# Altium footprint library XU-GENARAL PCB .PcbLib: 1176 footprints (part 29 of 75)
Each footprint in its own frame and in the unit in brackets; x right, y up, seen from the top. Pads: shape width x height; smd on the part's side, far side on the other; paste and mask are expansions set on the pad; w line width, h text height; cw(c..) or ccw(c..) is an arc to the next point about the centre after c.
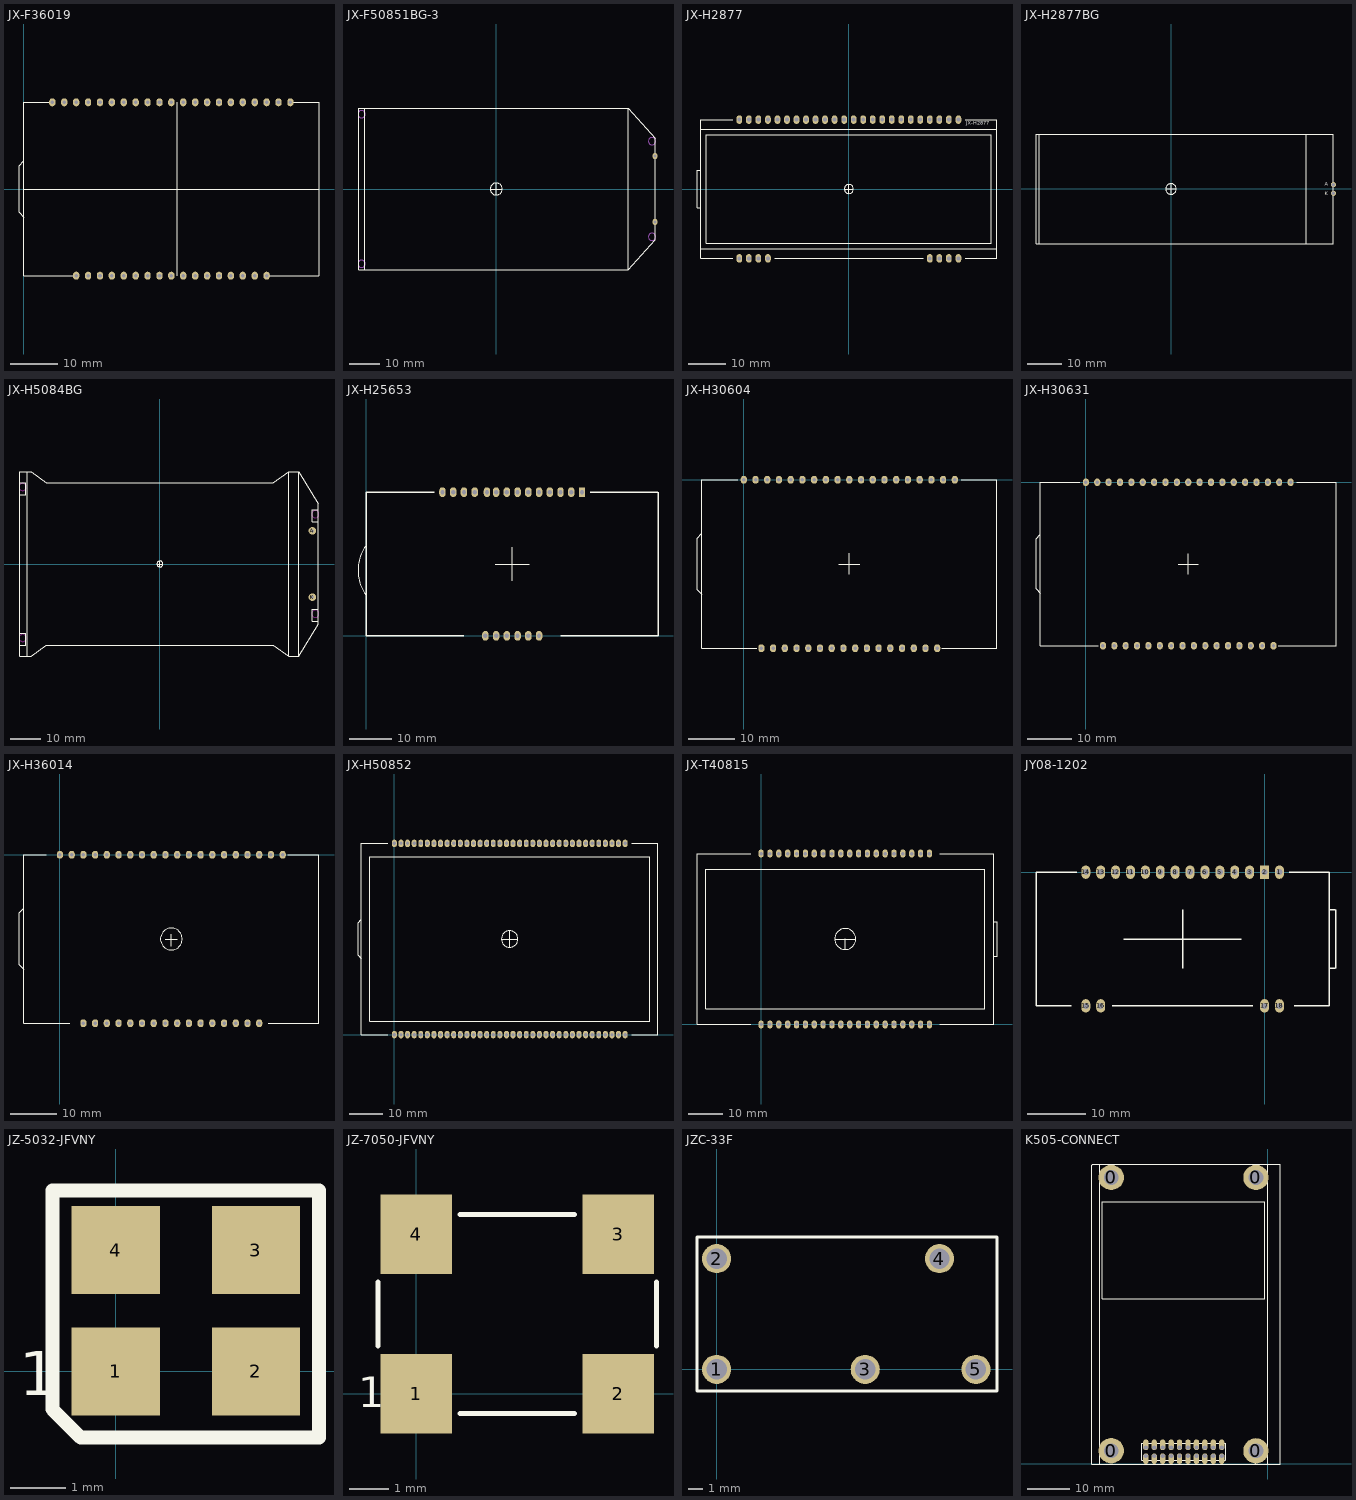
[diagram p28: the footprints below, top view; thin cyan lines are the x and y axes]

## JX-F36019 [mm]
pads (38):
  oval 1.35x1.7 hole 0.762: 1(6.092,18.505) 2(8.632,18.505) 3(11.172,18.505) 4(13.712,18.505) 5(16.252,18.505) 6(18.792,18.505) 7(21.332,18.505) 8(23.872,18.505) 9(26.412,18.505) 10(28.952,18.505) 11(31.492,18.505) 12(34.032,18.505) 13(36.572,18.505) 14(39.112,18.505) 15(41.652,18.505) 16(44.192,18.505) 17(46.732,18.505) 18(49.272,18.505) 19(51.812,18.505) 20(54.352,18.505) 21(56.892,18.505) 22(51.812,-18.495) 23(49.272,-18.495) 24(46.732,-18.495) 25(44.192,-18.495) 26(41.652,-18.495) 27(39.112,-18.495) 28(36.572,-18.495) 29(34.032,-18.495) 30(31.492,-18.495) 31(28.952,-18.495) 32(26.412,-18.495) 33(23.872,-18.495) 34(21.332,-18.495) 35(18.792,-18.495) 36(16.252,-18.495) 37(13.712,-18.495) 38(11.172,-18.495)
Top Overlay:
  lines w0.203: -1.025,4.994 -0.025,5.994 ; -1.016,5 -1.016,-5 -0.016,-6 ; -0.008,18.505 6.092,18.505 ; -0.004,18.505 -0.004,-18.495 11.172,-18.495 ; 0,0 1.266,0 62.988,0 ; 32.762,-18.495 32.762,18.513 ; 51.812,-18.495 62.988,-18.495 ; 56.892,18.505 62.992,18.505 62.992,-18.495

## JX-F50851BG-3 [mm]
pads (2):
  oval 1.6x2 hole 1: A(53,11) K(53,-11)
Top Overlay:
  circle w0.127: c0,0 r2
  lines w0.127: -2.032,0 0,0 ; 0,-2.032 0,0 ; 0,1.905 0,0 ; 2,0 0,0 ; -44,-27 44,-27 ; -44,-27 -44,27 ; -44,-27 -46,-27 -46,27 -44,27 ; -44,27 44,27 ; 44,-27 44,27 ; 44,-27 53,-17 53,17 44,27
Mechanical 1:
  circle w0.127: c-45,25 r1.2
  circle w0.127: c-45,-25 r1.2
  circle w0.127: c52,16 r1.2
  circle w0.127: c52,-16 r1.2

## JX-H2877 [mil]
pads (32):
  oval 60x90 hole 40: 1(-1149.88,728.35) 2(-1049.88,728.35) 3(-949.88,728.35) 4(-849.88,728.35) 5(-749.88,728.35) 6(-649.88,728.35) 7(-549.88,728.35) 8(-449.88,728.35) 9(-349.88,728.35) 10(-249.88,728.35) 11(-149.88,728.35) 12(-49.88,728.35) 13(50.12,728.35) 14(150.12,728.35) 15(250.12,728.35) 16(350.12,728.35) 17(450.12,728.35) 18(550.12,728.35) 19(650.12,728.35) 20(750.12,728.35) 21(850.12,728.35) 22(950.12,728.35) 23(1050.12,728.35) 24(1150.12,728.35) 25(-1149.88,-728.35) 26(-1049.88,-728.35) 27(-949.88,-728.35) 28(-849.88,-728.35) 29(850.12,-728.35) 30(950.12,-728.35) 31(1050.12,-728.35) 32(1150.12,-728.35)
Top Overlay:
  circle w5: c0.12,0 r47.24
  lines w5: -1555,-629.92 1555.24,-629.92 ; -1555,-196.65 -1555.2,-196.85 -1594.37,-196.85 -1594.37,196.85 -1555,196.85 ; -1555,629.92 1555.24,629.92 ; -1220,-728.35 -1555,-728.35 -1555,728.35 -1220,728.35 ; -780,-728.35 780,-728.35 ; -45,0 0,0 ; 0,-45 0,0 ; 0,45 0,0 ; 47.24,0 0,0 ; 1220,-728.35 1555.24,-728.35 1555.24,728.35 1220,728.35 ; -1495.94,570.87 -1495.94,-570.87 1496.18,-570.87 1496.18,570.87 ; -1495.94,570.87 1496.18,570.87 ; -1495.94,570.87 1496.18,570.87
  text "JX-H2877" at 1235,675 h40

## JX-H2877BG [mm]
pads (2):
  round 1.5 hole 1: A(47.503,1.27) K(47.503,-1.27)
Top Overlay:
  circle w0.127: c0.003,-0.002 r1.545
  lines w0.127: -38.497,-16.002 -38.497,15.998 ; -1.524,0 1.546,0 ; 0,-1.524 0,0 0,1.524 ; 39.503,-16.002 39.503,15.998 ; -39.497,-16.002 -39.497,15.998 47.503,15.998 47.503,-16.002 -39.497,-16.002
  text "A" at 44.958,1.016 h1.02
  text "K" at 44.958,-1.778 h1.02

## JX-H5084BG [mm]
pads (2):
  round 2.5 hole 1: A(50.5,11) K(50.5,-11)
Top Overlay:
  circle w0.127: c0,0 r1
  lines w0.127: -46.5,23 -44.5,23 -44.5,27 -46.5,27 ; -46.482,-27 -44.482,-27 -44.482,-23 -46.482,-23 ; -44,-30.5 -44,30.5 ; -1.016,0 0,0 ; 0,-1.016 0,0 ; 0,0.889 0,0 ; 1,0 0,0 ; 51.689,-15 52.5,-15 ; 51.689,18 52.5,18 ; 42.6,-30.5 42.6,30.5 ; 42.6,-30.5 37.6,-27 -37.6,-27 -42.6,-30.5 -46.5,-30.5 -46.5,30.5 -42.6,30.5 -37.6,27 37.6,27 42.6,30.5 ; 42.6,-30.5 46,-30.5 ; 42.6,30.5 46,30.5 ; 46,-30.5 46,30.5 ; 46,-30.5 52.5,-20 52.5,20 46,30.5 ; 52.5,-15 50.5,-15 50.5,-19 52.5,-19 52.5,-15 ; 52.5,18 50.5,18 50.5,14 52.5,14 52.5,18
Keep-Out Layer:
  circle w0.1: c-45.5,25.5 r1.2
  circle w0.1: c-45.482,-24.5 r1.2
  circle w0.1: c51.5,16.5 r1.2
  circle w0.1: c51.5,-16.5 r1.2

## JX-H25653 [mil]
pads (20):
  rect 60x90 hole 40: 1(2008.27,1338.58)
  oval 60x90 hole 40: 2(1908.27,1338.58) 3(1808.27,1338.58) 4(1708.27,1338.58) 5(1608.27,1338.58) 6(1508.27,1338.58) 7(1408.27,1338.58) 8(1308.27,1338.58) 9(1208.27,1338.58) 10(1122.84,1338.58) 11(1008.27,1338.58) 12(908.27,1338.58) 13(808.27,1338.58) 14(708.27,1338.58) 15(1108.27,0) 16(1208.27,0) 17(1308.27,0) 18(1408.27,0) 19(1508.27,0) 20(1608.27,0)
Top Overlay:
  lines w10: -7.54,384.42 cw(c314.96,610.24) -7.54,836.05 ; 1200.79,669.29 1358.27,669.29 ; 1358.27,511.81 1358.27,669.29 ; 1358.27,826.77 1358.27,669.29 ; 1515.75,669.29 1358.27,669.29
  lines w11.81: 629.92,1338.58 0,1338.58 0,0 908.27,0 ; 1808.27,0 2716.53,0 2716.53,1338.58 ; 2086.08,1338.58 2716,1338.58

## JX-H30604 [mm]
pads (35):
  oval 1.35x1.7 hole 0.762: 1(0,0) 2(2.54,0) 3(5.08,0) 4(7.62,0) 5(10.16,0) 6(12.7,0) 7(15.24,0) 8(17.78,0) 9(20.32,0) 10(22.86,0) 11(25.4,0) 12(27.94,0) 13(30.48,0) 14(33.02,0) 15(35.56,0) 16(38.1,0) 17(40.64,0) 18(43.18,0) 19(45.72,0) 20(41.91,-36.5) 21(39.37,-36.5) 22(36.83,-36.5) 23(34.29,-36.5) 24(31.75,-36.5) 25(29.21,-36.5) 26(26.67,-36.5) 27(24.13,-36.5) 28(21.59,-36.5) 29(19.05,-36.5) 30(16.51,-36.5) 31(13.97,-36.5) 32(11.43,-36.5) 33(8.89,-36.5) 34(6.35,-36.5) 35(3.81,-36.5)
Top Overlay:
  lines w0.203: -9.14,-24.816 -9.14,-24.8 -10.14,-23.8 -10.14,-12.624 -9.14,-11.624 ; -1.346,0 -9.14,0 -9.14,-36.5 2.794,-36.5 ; 20.612,-18.25 21.59,-18.25 24.13,-18.25 25.108,-18.25 ; 22.86,-20.498 22.86,-19.736 22.86,-17.196 ; 22.86,-17.704 22.86,-16.434 22.86,-15.926 ; 42.926,-36.5 54.86,-36.5 54.86,0 47.066,0

## JX-H30631 [mm]
pads (35):
  oval 1.35x1.7 hole 0.762: 1(0,0) 2(2.54,0) 3(5.08,0) 4(7.62,0) 5(10.16,0) 6(12.7,0) 7(15.24,0) 8(17.78,0) 9(20.32,0) 10(22.86,0) 11(25.4,0) 12(27.94,0) 13(30.48,0) 14(33.02,0) 15(35.56,0) 16(38.1,0) 17(40.64,0) 18(43.18,0) 19(45.72,0) 20(41.91,-36.5) 21(39.37,-36.5) 22(36.83,-36.5) 23(34.29,-36.5) 24(31.75,-36.5) 25(29.21,-36.5) 26(26.67,-36.5) 27(24.13,-36.5) 28(21.59,-36.5) 29(19.05,-36.5) 30(16.51,-36.5) 31(13.97,-36.5) 32(11.43,-36.5) 33(8.89,-36.5) 34(6.35,-36.5) 35(3.81,-36.5)
Top Overlay:
  lines w0.203: -10.14,-24.8 -11.14,-23.8 -11.14,-12.624 -10.14,-11.624 ; -1.346,0 -10.14,0 -10.14,-36.5 2.794,-36.5 ; 20.612,-18.25 21.59,-18.25 24.13,-18.25 25.108,-18.25 ; 22.86,-20.498 22.86,-19.736 22.86,-17.196 ; 22.86,-17.704 22.86,-16.434 22.86,-15.926 ; 42.926,-36.5 55.86,-36.5 55.86,0 47.066,0

## JX-H36014 [mm]
pads (38):
  oval 1.35x1.7 hole 0.762: 1(0,0) 1(0,0) 2(2.54,0) 3(5.08,0) 4(7.62,0) 5(10.16,0) 6(12.7,0) 7(15.24,0) 8(17.78,0) 9(20.32,0) 10(22.86,0) 11(25.4,0) 12(27.94,0) 13(30.48,0) 14(33.02,0) 15(35.56,0) 16(38.1,0) 17(40.64,0) 18(43.18,0) 19(45.72,0) 20(48.26,0) 21(43.18,-36.5) 21(43.18,-36.5) 22(40.64,-36.5) 23(38.1,-36.5) 24(35.56,-36.5) 25(33.02,-36.5) 26(30.48,-36.5) 27(27.94,-36.5) 28(25.4,-36.5) 29(22.86,-36.5) 30(20.32,-36.5) 31(17.78,-36.5) 32(15.24,-36.5) 33(12.7,-36.5) 34(10.16,-36.5) 35(7.62,-36.5) 36(5.08,-36.5)
Top Overlay:
  circle w0.203: c24.13,-18.25 r2.357
  lines w0.203: -7.87,-24.788 -8.87,-23.788 -8.87,-12.612 -7.87,-11.612 ; -3,0 -7.87,0 -7.87,-36.5 2.13,-36.5 ; 22.844,-18.25 25.384,-18.25 ; 24.13,-19.774 24.13,-17.234 ; 45.13,-36.5 56.13,-36.5 56.13,0 49.38,0

## JX-H50852 [mm]
pads (72):
  oval 1.5x2.286 hole 1.016: 1(0,0) 2(2,0) 3(4,0) 4(6,0) 5(8,0) 6(10,0) 7(12,0) 8(14,0) 9(16,0) 10(18,0) 11(20,0) 12(22,0) 13(24,0) 14(26,0) 15(28,0) 16(30,0) 17(32,0) 18(34,0) 19(36,0) 20(38,0) 21(40,0) 22(42,0) 23(44,0) 24(46,0) 25(48,0) 26(50,0) 27(52,0) 28(54,0) 29(56,0) 30(58,0) 31(60,0) 32(62,0) 33(64,0) 34(66,0) 35(68,0) 36(70,0) 37(70,58) 38(68,58) 39(66,58) 40(64,58) 41(62,58) 42(60,58) 43(58,58) 44(56,58) 45(54,58) 46(52,58) 47(50,58) 48(48,58) 49(46,58) 50(44,58) 51(42,58) 52(40,58) 53(38,58) 54(36,58) 55(34,58) 56(32,58) 57(30,58) 58(28,58) 59(26,58) 60(24,58) 61(22,58) 62(20,58) 63(18,58) 64(16,58) 65(14,58) 66(12,58) 67(10,58) 68(8,58) 69(6,58) 70(4,58) 71(2,58) 72(0,58)
Top Overlay:
  circle w0.254: c34.968,29 r2.5
  lines w0.203: -10.032,23 -11.032,24 -11.032,29 -11.032,34 -10.032,35 ; -2.032,0 -10.032,0 -10.032,58 -2.032,58 ; 32.468,29 37.468,29 ; 34.968,26.5 34.968,31.5 ; 71.968,0 79.968,0 79.968,58 71.968,58 ; -7.532,4 77.468,4 77.468,54 -7.532,54 -7.532,4

## JX-T40815 [mil]
pads (40):
  oval 59.05x90 hole 40: 1(0,0) 2(100,0) 3(200,0) 4(300,0) 5(400,0) 6(500,0) 7(600,0) 8(700,0) 9(800,0) 10(900,0) 11(1000,0) 12(1100,0) 13(1200,0) 14(1300,0) 15(1400,0) 16(1500,0) 17(1600,0) 18(1700,0) 19(1800,0) 20(1900,0) 21(1900,1929.13) 22(1800,1929.13) 23(1700,1929.13) 24(1600,1929.13) 25(1500,1929.13) 26(1400,1929.13) 27(1300,1929.13) 28(1200,1929.13) 29(1100,1929.13) 30(1000,1929.13) 31(900,1929.13) 32(800,1929.13) 33(700,1929.13) 34(600,1929.13) 35(500,1929.13) 36(400,1929.13) 37(300,1929.13) 38(200,1929.13) 39(100,1929.13) 40(0,1929.13)
Top Overlay:
  circle w10: c950,964.57 r118.11
  lines w10: -118.11,0 -723.23,0 -723.23,1929.13 -118.11,1929.13 ; 0,-32.77 0,0 ; 100,-30.23 100,0 ; 831.77,964.57 1067.68,964.57 ; 950,845 950,965 ; 2018.11,0 2623.23,0 2623.23,1929.13 2018.11,1929.13 ; 2623.47,767.3 2662.43,767.3 2662.43,964.15 2662.43,1161 2623.77,1161 ; -624.8,177.16 -624.8,1751.97 2524.8,1751.97 2524.8,177.16 -624.8,177.16

## JY08-1202 [mil]
pads (18):
  oval 60x90 hole 40: 1(100,0) 3(-100,0) 4(-200,0) 5(-300,0) 6(-400,0) 7(-500,0) 8(-600,0) 9(-700,0) 10(-800,0) 11(-900,0) 12(-1000,0) 13(-1100,0) 14(-1200,0) 15(-1200,-897.64) 16(-1100,-897.64) 17(0,-897.64) 18(100,-897.64)
  rect 60x90 hole 40: 2(0,0)
Top Overlay:
  lines w10: -1534.25,-897.64 -1298.03,-897.64 ; -1534.21,-897.64 -1534.21,0 ; -1534.09,0 -1259.84,0 ; -1022.44,-897.64 -77.56,-897.64 ; -943.7,-448.82 -156.3,-448.82 ; -550,-645.67 -550,-251.97 ; 166.93,0 434.25,0 434.25,-897.64 198.03,-897.64 ; 434.25,-645.67 473.62,-645.67 ; 434.25,-251.97 473.62,-251.97 ; 479.75,-645.67 479.75,-251.97

## JZ-5032-JFVNY [mm]
pads (4):
  rect 1.6x1.6 smd: 1(0,0) 2(2.54,0) 3(2.54,2.2) 4(0,2.2)
Top Overlay:
  lines w0.25: 2.134,3.277 3.683,3.277 3.683,-0.94 3.683,-1.194 -0.635,-1.194 -1.143,-0.686 -1.143,3.277 2.667,3.277
  text "1" at -1.753,-0.432 h0.8

## JZ-7050-JFVNY [mm]
pads (4):
  rect 1.8x2 smd: 1(0,0) 2(5.08,0) 3(5.08,4) 4(0,4)
Top Overlay:
  lines w0.127: -0.96,1.2 -0.96,2.8 ; 1.1,-0.5 3.98,-0.5 ; 1.1,4.5 3.98,4.5 ; 6.04,1.2 6.04,2.8
  text "1" at -1.461,-0.35 h0.76

## JZC-33F [mm]
pads (5):
  round 2 hole 1.4: 1(0,0) 2(0,7.6) 3(10.2,0) 4(15.3,7.6) 5(17.8,0)
Top Overlay:
  lines w0.203: -1.35,-1.5 19.25,-1.5 19.25,9.1 -1.35,9.1 -1.35,-1.5

## K505-CONNECT [mm]
height 0.55
pads (24):
  round 6 hole 3.5: 0(-37.114,3.15) 0(-37.114,67.924) 0(-2.814,3.124) 0(-2.814,67.924)
  oval 1.27x2.54 hole 1.016 copper offset 0,-0.635: 1(-10.919,1.9) 3(-12.919,1.9) 5(-14.919,1.9) 7(-16.919,1.9) 9(-18.919,1.9) 11(-20.919,1.9) 13(-22.919,1.9) 15(-24.919,1.9) 17(-26.919,1.9) 19(-28.919,1.9)
  oval 1.27x2.54 hole 1.016 copper offset 0,0.635: 2(-10.919,3.9) 4(-12.919,3.9) 6(-14.919,3.9) 8(-16.919,3.9) 10(-18.919,3.9) 12(-20.919,3.9) 14(-22.919,3.9) 16(-24.919,3.9) 18(-26.919,3.9) 20(-28.919,3.9)
Top Overlay:
  lines w0.254: -39.624,71.12 -41.529,71.12 -41.783,70.866 -41.783,0 -36.878,0 ; -10.142,0.928 -29.878,0.928 -29.878,4.84 -29.827,4.891 -10.066,4.891 ; -9.964,0.928 -9.964,4.916 ; -2.814,0 -2.814,3.15 ; -0.508,71.12 2.921,71.12 3,71.041 3,0 0,0 ; -39.878,0 0.036,0 0.036,71.1 -39.878,71.1 -39.878,0 ; -39.191,39.13 -0.691,39.13 -0.691,62.13 -39.191,62.13 -39.191,39.13